# Altium schematic symbol library AD_Lib.SchLib: 1239 symbols (part 8 of 9) (continued)
## R2512_470/200V
designator R?, comment 470¦¸,1W
ÌùÆ¬µç×è; Manufacturer: KOA; pro-environment: RoHS; Quality: -55~155¡æ; other: 470¦¸,1W,1%,200V; OPN: RK73HW3ATTE4700F; PadsNum: 2; SN: SN; Category: µç×è; Part: RK73HW3ATTE4700F; Value: 470¦¸,1W; QTY: 4000; OPN_JLC: OPN_JLC; SN_JLC: SN_JLC; Price_JLC: 0
footprint R2512 (¹«ÖÆ6432£»Ó¢ÖÆ2512£»¹¦ÂÊ1W)
pins: 1, 2

## R2512_560/200V
designator R?, comment 560¦¸,1W
ÌùÆ¬µç×è; Manufacturer: KOA; pro-environment: RoHS; Quality: -55~155¡æ; other: 560¦¸,1W,1%,200V; OPN: RK73HW3ATTE5600F; PadsNum: 2; SN: SN; Category: µç×è; Part: RK73HW3ATTE5600F; Value: 560¦¸,1W; QTY: 4000; OPN_JLC: OPN_JLC; SN_JLC: SN_JLC; Price_JLC: 0
footprint R2512 (¹«ÖÆ6432£»Ó¢ÖÆ2512£»¹¦ÂÊ1W)
pins: 1, 2

## R2512_681/200V@2
designator R?, comment 681¦¸,1W
ÌùÆ¬µç×è; Manufacturer: Panasonic; pro-environment: RoHS; Quality: -55~155¡æ; other: 681¦¸,1W,5%,200V; OPN: ERJ-1TYJ681U; PadsNum: 2; SN: SN; Category: µç×è; Part: ERJ-1TYJ681U; Value: 681¦¸,1W; QTY: 4000; Price: 0.50778; OPN_JLC: OPN_JLC; SN_JLC: SN_JLC; Price_JLC: 0
footprint R2512 (¹«ÖÆ6432£»Ó¢ÖÆ2512£»¹¦ÂÊ1W)
pins: 1, 2

## R2512_750/200V
designator R?, comment 750¦¸,1W
ÌùÆ¬µç×è; Manufacturer: KOA; Part: RK73HW3ATTE5600F; pro-environment: RoHS; Quality: -55~155¡æ; other: 750¦¸,1W,1%,200V; OPN: RK73HW3ATTE7500F; PadsNum: 2; SN: SN; Category: µç×è; Value: 750¦¸,1W; QTY: 4000; OPN_JLC: OPN_JLC; SN_JLC: SN_JLC; Price_JLC: 0
footprint R2512 (¹«ÖÆ6432£»Ó¢ÖÆ2512£»¹¦ÂÊ1W)
pins: 1, 2

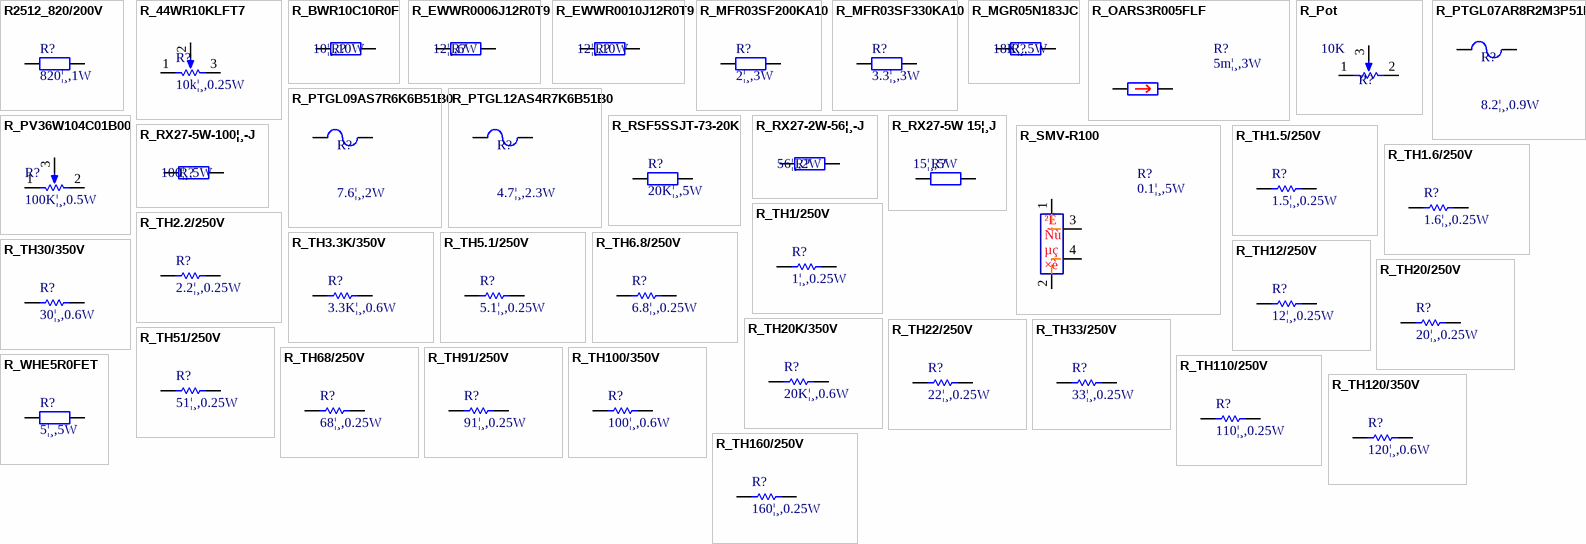
[diagram p36: symbols R2512_820/200V to R_WHE5R0FET]

## R2512_820/200V
designator R?, comment 820¦¸,1W
ÌùÆ¬µç×è; Manufacturer: KOA; pro-environment: RoHS; Quality: -55~155¡æ; other: 820¦¸,1W,1%,200V; OPN: RK73HW3ATTE8200F; PadsNum: 2; SN: SN; Category: µç×è; Part: RK73HW3ATTE8200F; Value: 820¦¸,1W; QTY: 4000; OPN_JLC: OPN_JLC; SN_JLC: SN_JLC; Price_JLC: 0
footprint R2512 (¹«ÖÆ6432£»Ó¢ÖÆ2512£»¹¦ÂÊ1W)
pins: 1, 2

## R_44WR10KLFT7
designator R?, comment 10k¦¸,0.25W
µçÎ»Æ÷,10k¦¸; Manufacturer: TT Electronics; pro-environment: RoHS; Quality: -65~150¡æ; other: 10k¦¸,0.25W,10%; OPN: 44WR10KLFT7; PadsNum: 0; SN: SN; Category: µç×è; Part: 44WR10KLFT7; Value: 10k¦¸,0.25W; QTY: 250; Price: 14.6367; OPN_JLC: OPN_JLC; SN_JLC: SN_JLC; Price_JLC: 0
footprint R_POT_44W (±íÌùµçÎ»Æ÷£¬Èç44WR10KLFT7)
pins: 1 TOP, 2 TAP, 3 BOT

## R_BWR10C10R0F
designator R?, comment 10¦¸,10W
¹¦ÂÊµç×è,10¦¸,10W; Manufacturer: KOA; Part: BWR10C10R0F; Quality: -40¡æ~155¡æ; SN: 03.4.38.12.99010001S; other: 10¦¸,10W,5%,100ppm; PadsNum: 0; QTY: ?; Value: 10¦¸,10W; Price: ?; Category: µç×è; OPN: BWR10C10R0F; OPN_JLC: OPN_JLC; SN_JLC: SN_JLC; Price_JLC: 0
footprint BWR10 (KOAÖ®BWR10ÏµÁÐË®Äàµç×è£¬10W)
pins: 1, 2

## R_EWWR0006J12R0T9
designator R?, comment 12¦¸,6W
¹¦ÂÊµç×è; 12¦¸; 6W; Manufacturer: ¿ª²½î£Ë¼; Part: EWWR0006J12R0T9; Quality: -40¡æ~155¡æ; other: 12¦¸,6W,5%; PadsNum: 0; SN: SN; QTY: 100; Value: 12¦¸,6W; Price: -; Category: µç×è; OPN: -; OPN_JLC: EWWR0006J12R0T9; SN_JLC: C348949; Price_JLC: 2.03
footprint R_EWWR0006 (Footprint not found)
pins: 1, 2

## R_EWWR0010J12R0T9
designator R?, comment 12¦¸,10W
¹¦ÂÊµç×è; 12¦¸; 10W; Manufacturer: ¿ª²½î£Ë¼; Part: EWWR0010J12R0T9; Quality: -40¡æ~155¡æ; other: 12¦¸,10W,5%; PadsNum: 0; SN: SN; QTY: 50; Value: 12¦¸,10W; Price: -; Category: µç×è; OPN: -; OPN_JLC: EWWR0010J12R0T9; SN_JLC: C349086; Price_JLC: 3.24
footprint R_EWWR0010 (¿ª²½î£Ë¼Ö®EWWR0010ÏµÁÐ¹¤¾ßµç×è£¬ÈçEWWR0010J12R0T9)
pins: 1, 2

## R_MFR03SF200KA10
designator R?, comment 2¦¸,3W
¹¦ÂÊµç×è; 2¦¸/3W; 1%; 50ppm; Manufacturer: UNI-ROYAL; pro-environment: RoHS; Quality: -55~150¡æ; other: 2¦¸,3W,1%,50ppm; OPN: MFR03SF200KA10; PadsNum: 0; SN: SN; Category: µç×è; Part: MFR03SF200KA10; Value: 2¦¸,3W; QTY: 1000; Price: -; OPN_JLC: MFR03SF200KA10; SN_JLC: C69890; Price_JLC: 0.229423
footprint R_MF3WS (Footprint not found)
pins: 1, 2

## R_MFR03SF330KA10
designator R?, comment 3.3¦¸,3W
¹¦ÂÊµç×è; 3.3¦¸/3W; 1%; 50ppm; Manufacturer: UNI-ROYAL; pro-environment: RoHS; Quality: -55~150¡æ; other: 3.3¦¸,3W,1%,50ppm; OPN: MFR03SF330KA10; PadsNum: 0; SN: SN; Category: µç×è; Part: MFR03SF330KA10; Value: 3.3¦¸,3W; QTY: 1000; Price: -; OPN_JLC: MFR03SF330KA10; SN_JLC: C83331; Price_JLC: 0.233533
footprint R_MF3WS (Footprint not found)
pins: 1, 2

## R_MGR05N183JC
designator R?, comment 18K¦¸,5W
¹¦ÂÊµç×è,18K¦¸,5W; Manufacturer: Ã×¿âÁú; Part: MGR05N183JC; Quality: -55¡æ~125¡æ; PadsNum: 0; SN: SN; QTY: ?; Value: 18K¦¸,5W; Price: ?; Category: µç×è; OPN: MGR05N183JC; OPN_JLC: OPN_JLC; SN_JLC: SN_JLC; Price_JLC: 0
footprint MGR05 (Ã×¿âÁúÖ®Ë®Äàµç×è)
pins: 1, 2

## R_OARS3R005FLF
designator R?, comment 5m¦¸,3W
²ÉÑùµç×è; 5m¦¸; 3W; Manufacturer: TT Electronics; Other: 5m¦¸;3W;1%;40ppm; Quality: -55~140¡æ; pro-environment: RoHS; SN: 03.4.38.27.993R0001S; OPN: OARS3R005FLF; PadsNum: 0; Value: 5m¦¸,3W; Price: 4.4928; Category: µç×è; OPN_JLC: OPN_JLC; SN_JLC: SN_JLC; Price_JLC: 0
footprint R2512 (¹«ÖÆ6432£»Ó¢ÖÆ2512£»¹¦ÂÊ1W)
pins: 1, 2

## R_Pot
designator R?, comment 10K
µçÎ»Æ÷; PadsNum: 0; OPN_JLC: OPN_JLC; SN_JLC: SN_JLC; Price_JLC: 0
footprint Rpot1 (Variable Resistor, Thru-Hole; 3 Leads)
footprint Rpot2 (Variable Resistor, Thru-Hole; 3 Leads)
pins: 1 TOP, 2 BOT, 3 TAP
1 alternate drawing of the same symbol

## R_PTGL07AR8R2M3P51B0
designator R?, comment 8.2¦¸,0.9W
PTC; 0.16A/56V; 8.2¦¸; Manufacturer: Murata; Other: 0.16A;56V;20%; Quality: -10¡æ~60¡æ; pro-environment: RoHS; SN: 03.4.38.17.9904R701S; OPN: PTGL12AS4R7K6B51B0; PadsNum: 0; Value: 8.2¦¸,0.9W; QTY: 500; part: PTGL12AS4R7K6B51B0; Price: 4.6215; OPN_JLC: OPN_JLC; SN_JLC: SN_JLC; Price_JLC: 0; Category: ÈÈÃôµç×è
footprint PTGL07AR8R2M3P (MurutaÖ®PTC£¬PTGL07AR8R2M3PÏµÁÐ)
pins: 1, 2

## R_PTGL09AS7R6K6B51B0
designator R?, comment 7.6¦¸,2W
PTC; 2.2A/140V; 7.6¦¸; Manufacturer: Murata; Other: 2.2A;140V;10%; Quality: -30¡æ~85¡æ; pro-environment: RoHS; OPN: PTGL09AS7R6K6B51B0; PadsNum: 0; Value: 7.6¦¸,2W; SN: SN; QTY: 500; part: PTGL09AS7R6K6B51B0; Price: 4.9725; OPN_JLC: OPN_JLC; SN_JLC: SN_JLC; Price_JLC: 0; Category: ÈÈÃôµç×è
footprint PTGL09AS4R7K6B (MurutaÖ®PTC£¬PTGL09AS4R7K6BÏµÁÐ)
pins: 1, 2

## R_PTGL12AS4R7K6B51B0
designator R?, comment 4.7¦¸,2.3W
PTC; 3.5A/140V; 4.7¦¸; Manufacturer: Murata; Other: 3.5A;140V;10%; Quality: -30¡æ~85¡æ; pro-environment: RoHS; SN: 03.4.38.17.9904R701S; OPN: PTGL12AS4R7K6B51B0; PadsNum: 0; Value: 4.7¦¸,2.3W; QTY: 300; part: PTGL12AS4R7K6B51B0; Price: 6.9732; OPN_JLC: OPN_JLC; SN_JLC: SN_JLC; Price_JLC: 0; Category: ÈÈÃôµç×è
footprint PTGL12AS4R7K6B (MurutaÖ®PTC£¬PTGL12AS4R7K6BÏµÁÐ)
pins: 1, 2

## R_PV36W104C01B00
designator R?, comment 100K¦¸,0.5W
µçÎ»Æ÷,100k¦¸,25turn; Manufacturer: Bourns; pro-environment: RoHS; Quality: -55~155¡æ; SN: 03.4.38.29.99010401S; other: 100k¦¸,0.5W,10%,25turn; OPN: PV36W104C01B00; PadsNum: 0; Category: µç×è; Part: PV36W104C01B00; Value: 100K¦¸,0.5W; QTY: 100; Price: 8.4942; OPN_JLC: OPN_JLC; SN_JLC: SN_JLC; Price_JLC: 0
footprint Rpot1 (Variable Resistor, Thru-Hole; 3 Leads)
pins: 1 TOP, 2 BOT, 3 TAP

## R_RSF5SSJT-73-20K
designator R?, comment 20K¦¸,5W
Ö±²åµç×è,20K,5W; Manufacturer: Yageo; pro-environment: RoHS; Quality: -55~155¡æ; other: 20k¦¸,0.6W,1%,350V; OPN: RSF5SSJT-73-20K; PadsNum: 0; SN: SN; Category: µç×è; Part: RSF5SSJT-73-20K; Value: 20K¦¸,5W; QTY: 5000; Price: 0.07722; OPN_JLC: OPN_JLC; SN_JLC: SN_JLC; Price_JLC: 0
footprint RSF5SS
pins: 1, 2

## R_RX27-2W-56¦¸-J
designator R?, comment 56¦¸,2W
¹¦ÂÊµç×è,56¦¸,2W; Manufacturer: ËÄ´¨ÓÀÐÇ; Part: RX27-2W-56¦¸-J; Quality: -55¡æ~ +70¡æ; SN: 03.4.38.12.99056001S; PadsNum: 0; QTY: 200; Value: 56¦¸,2W; Price: ?; Category: µç×è; OPN: RX27-2W-56¦¸-J; OPN_JLC: OPN_JLC; SN_JLC: SN_JLC; Price_JLC: 0
footprint RX27-2W
pins: 1, 2

## R_RX27-5W 15¦¸J
designator R?, comment 15¦¸,5W
¹¦ÂÊµç×è,15¦¸,5W; Manufacturer: ËÄ´¨ÓÀÐÇ; Part: RY27-5W 15¦¸J; Quality: -55¡æ~ +70¡æ; SN: 03.4.38.12.99015001S; PadsNum: 0; QTY: 200; Price: ?; Category: µç×è; OPN: RY27-5W 15¦¸J; other: 15¦¸,5W; Value: 15¦¸,5W; OPN_JLC: OPN_JLC; SN_JLC: SN_JLC; Price_JLC: 0
footprint RX27-5W
pins: 1, 2

## R_RX27-5W-100¦¸-J
designator R?, comment 100¦¸,5W
¹¦ÂÊµç×è,100¦¸,5W; Manufacturer: ËÄ´¨ÓÀÐÇ; Part: RX27-5W-100¦¸-J; Quality: -55¡æ~ +70¡æ; SN: 03.4.38.12.99010101S; PadsNum: 0; QTY: 200; Value: 100¦¸,5W; Price: ?; Category: µç×è; OPN: RX27-5W-100¦¸-J; OPN_JLC: OPN_JLC; SN_JLC: SN_JLC; Price_JLC: 0
footprint RX27-5W
pins: 1, 2

## R_SMV-R100
designator R?, comment 0.1¦¸,5W
²ÉÑùµç×è; Manufacturer: Isabellenhuette; Other: 1%;30ppm; Quality: -55~140¡æ; pro-environment: RoHS; OPN: SMV-R100-1.0; PadsNum: 0; SN: SN; Value: 0.1¦¸,5W; Price: ?; Category: µç×è; OPN_JLC: OPN_JLC; SN_JLC: SN_JLC; Price_JLC: 0
footprint SMV
pins: 1, 2, 3, 4
text: ²É; Ñù; µç; ×è

## R_TH1.5/250V
designator R?, comment 1.5¦¸,0.25W
Ö±²åµç×è; 0.25W; Manufacturer: UNI-ROYAL; pro-environment: RoHS; Quality: -55~155¡æ; other: 1.5¦¸,0.25W,1%,250V; OPN: MFR0W4F150KA50; PadsNum: 0; SN: SN; Category: µç×è; Part: MFR0W4F150KA50; Value: 1.5¦¸,0.25W; QTY: 5000; Price: 0.049701; OPN_JLC: MFR0W4F150KA50; SN_JLC: C69894; Price_JLC: 0
footprint R_AXIAL0.4 (Axial Device, Thru-Hole; 2 Leads; 0.4 in Pin Spacing)
pins: 1, 2

## R_TH1.6/250V
designator R?, comment 1.6¦¸,0.25W
Ö±²åµç×è; 0.25W; Manufacturer: UNI-ROYAL; pro-environment: RoHS; Quality: -55~155¡æ; other: 1.6¦¸,0.25W,1%,250V; OPN: MFR0W4F160KA50; PadsNum: 0; SN: SN; Category: µç×è; Part: MFR0W4F160KA50; Value: 1.6¦¸,0.25W; QTY: 5000; Price: 0.049701; OPN_JLC: MFR0W4F160KA50; SN_JLC: C66724; Price_JLC: 0
footprint R_AXIAL0.4 (Axial Device, Thru-Hole; 2 Leads; 0.4 in Pin Spacing)
pins: 1, 2

## R_TH1/250V
designator R?, comment 1¦¸,0.25W
Ö±²åµç×è; 0.25W; Manufacturer: UNI-ROYAL; pro-environment: RoHS; Quality: -55~155¡æ; other: 1¦¸,0.25W,1%,250V; OPN: MFR0W4F100KA50; PadsNum: 0; SN: SN; Category: µç×è; Part: MFR0W4F100KA50; Value: 1¦¸,0.25W; QTY: 5000; Price: 0.045941; OPN_JLC: MFR0W4F100KA50; SN_JLC: C69893; Price_JLC: 0
footprint R_AXIAL0.4 (Axial Device, Thru-Hole; 2 Leads; 0.4 in Pin Spacing)
pins: 1, 2

## R_TH2.2/250V
designator R?, comment 2.2¦¸,0.25W
Ö±²åµç×è; 0.25W; Manufacturer: UNI-ROYAL; pro-environment: RoHS; Quality: -55~155¡æ; other: 2.2¦¸,0.25W,1%,250V; OPN: MFR0W4F220KA50; PadsNum: 0; SN: SN; Category: µç×è; Part: MFR0W4F220KA50; Value: 2.2¦¸,0.25W; QTY: 5000; Price: 0.045831; OPN_JLC: MFR0W4F220KA50; SN_JLC: C59741; Price_JLC: 0
footprint R_AXIAL0.4 (Axial Device, Thru-Hole; 2 Leads; 0.4 in Pin Spacing)
pins: 1, 2

## R_TH3.3K/350V
designator R?, comment 3.3K¦¸,0.6W
Ö±²åµç×è; 0.6W; Manufacturer: Yageo; pro-environment: RoHS; Quality: -55~155¡æ; other: 3.3k¦¸,0.6W,1%,350V; OPN: MF0207FTE52-3K3; PadsNum: 0; SN: SN; Category: µç×è; Part: MF0207FTE52-3K3; Value: 3.3K¦¸,0.6W; QTY: 5000; Price: 0.07722; OPN_JLC: OPN_JLC; SN_JLC: SN_JLC; Price_JLC: 0
footprint R_AXIAL0.4 (Axial Device, Thru-Hole; 2 Leads; 0.4 in Pin Spacing)
pins: 1, 2

## R_TH5.1/250V
designator R?, comment 5.1¦¸,0.25W
Ö±²åµç×è; 0.25W; Manufacturer: UNI-ROYAL; pro-environment: RoHS; Quality: -55~155¡æ; other: 5.1¦¸,0.25W,1%,250V; OPN: MFR0W4F510KA50; PadsNum: 0; SN: SN; Category: µç×è; Part: MFR0W4F510KA50; Value: 5.1¦¸,0.25W; QTY: 5000; Price: 0.045941; OPN_JLC: MFR0W4F510KA50; SN_JLC: C58639; Price_JLC: 0
footprint R_AXIAL0.4 (Axial Device, Thru-Hole; 2 Leads; 0.4 in Pin Spacing)
pins: 1, 2

## R_TH6.8/250V
designator R?, comment 6.8¦¸,0.25W
Ö±²åµç×è; 0.25W; Manufacturer: Yageo; pro-environment: RoHS; Quality: -55~155¡æ; other: 6.8¦¸,0.25W,1%,250V; OPN: MFR-25FTF52-6R8; PadsNum: 0; SN: SN; Category: µç×è; Part: MFR-25FTF52-6R8; Value: 6.8¦¸,0.25W; QTY: 5000; Price: 0.13654; OPN_JLC: MFR-25FTF52-6R8; SN_JLC: C173062; Price_JLC: 0
footprint R_AXIAL0.4 (Axial Device, Thru-Hole; 2 Leads; 0.4 in Pin Spacing)
pins: 1, 2

## R_TH12/250V
designator R?, comment 12¦¸,0.25W
Ö±²åµç×è; 0.25W; Manufacturer: CCO(Ç§Ö¾µç×Ó); pro-environment: RoHS; Quality: -55~155¡æ; other: 12¦¸,0.25W,1%,250V; OPN: MF1/4W-12¦¸¡À1% T52; PadsNum: 0; SN: SN; Category: µç×è; Part: MF1/4W-12¦¸¡À1% T52; Value: 12¦¸,0.25W; QTY: 5000; Price: 0.036724; OPN_JLC: MF1/4W-12¦¸¡À1% T52; SN_JLC: C119283; Price_JLC: 0
footprint R_AXIAL0.4 (Axial Device, Thru-Hole; 2 Leads; 0.4 in Pin Spacing)
pins: 1, 2

## R_TH20/250V
designator R?, comment 20¦¸,0.25W
Ö±²åµç×è; 0.25W; Manufacturer: UNI-ROYAL; pro-environment: RoHS; Quality: -55~155¡æ; other: 20¦¸,0.25W,1%,250V; OPN: MFR0W4F200JA50; PadsNum: 0; SN: SN; Category: µç×è; Part: MFR0W4F200JA50; Value: 20¦¸,0.25W; QTY: 5000; Price: 0.035413; OPN_JLC: MFR0W4F200JA50; SN_JLC: C58663; Price_JLC: 0
footprint R_AXIAL0.4 (Axial Device, Thru-Hole; 2 Leads; 0.4 in Pin Spacing)
pins: 1, 2

## R_TH20K/350V
designator R?, comment 20K¦¸,0.6W
Ö±²åµç×è; 0.6W; Manufacturer: Yageo; pro-environment: RoHS; Quality: -55~155¡æ; SN: 03.4.38.30.99020301S; other: 20k¦¸,0.6W,1%,350V; OPN: MF0207FTE52-20K; PadsNum: 0; Category: µç×è; Part: MF0207FTE52-20K; Value: 20K¦¸,0.6W; QTY: 5000; Price: 0.07722; OPN_JLC: OPN_JLC; SN_JLC: SN_JLC; Price_JLC: 0
footprint R_AXIAL0.4 (Axial Device, Thru-Hole; 2 Leads; 0.4 in Pin Spacing)
pins: 1, 2

## R_TH22/250V
designator R?, comment 22¦¸,0.25W
Ö±²åµç×è; 0.25W; Manufacturer: UNI-ROYAL; pro-environment: RoHS; Quality: -55~155¡æ; other: 22¦¸,0.25W,1%,250V; OPN: MFR0W4F220JA50; PadsNum: 0; SN: SN; Category: µç×è; Part: MFR0W4F220JA50; Value: 22¦¸,0.25W; QTY: 5000; Price: 0.035328; OPN_JLC: MFR0W4F220JA50; SN_JLC: C58611; Price_JLC: 0
footprint R_AXIAL0.4 (Axial Device, Thru-Hole; 2 Leads; 0.4 in Pin Spacing)
pins: 1, 2

## R_TH30/350V
designator R?, comment 30¦¸,0.6W
Ö±²åµç×è; 0.6W; Manufacturer: Yageo; pro-environment: RoHS; Quality: -55~155¡æ; SN: 03.4.38.30.99030001S; other: 30¦¸,0.6W,1%,350V; OPN: MF0207FTE52-30R; PadsNum: 0; Category: µç×è; Part: MF0207FTE52-30R; Value: 30¦¸,0.6W; QTY: 5000; Price: 0.07722; OPN_JLC: OPN_JLC; SN_JLC: SN_JLC; Price_JLC: 0
footprint R_AXIAL0.4 (Axial Device, Thru-Hole; 2 Leads; 0.4 in Pin Spacing)
pins: 1, 2

## R_TH33/250V
designator R?, comment 33¦¸,0.25W
Ö±²åµç×è; 0.25W; Manufacturer: UNI-ROYAL; pro-environment: RoHS; Quality: -55~155¡æ; other: 33¦¸,0.25W,1%,250V; OPN: MFR0W4F330JA50; PadsNum: 0; SN: SN; Category: µç×è; Part: MFR0W4F330JA50; Value: 33¦¸,0.25W; QTY: 5000; Price: 0.035413; OPN_JLC: MFR0W4F330JA50; SN_JLC: C58650; Price_JLC: 0
footprint R_AXIAL0.4 (Axial Device, Thru-Hole; 2 Leads; 0.4 in Pin Spacing)
pins: 1, 2

## R_TH51/250V
designator R?, comment 51¦¸,0.25W
Ö±²åµç×è; 0.25W; Manufacturer: UNI-ROYAL; pro-environment: RoHS; Quality: -55~155¡æ; other: 51¦¸,0.25W,1%,250V; OPN: MFR0W4F510JA50; PadsNum: 0; SN: SN; Category: µç×è; Part: MFR0W4F510JA50; Value: 51¦¸,0.25W; QTY: 5000; Price: 0.035413; OPN_JLC: MFR0W4F510JA50; SN_JLC: C58637; Price_JLC: 0
footprint R_AXIAL0.4 (Axial Device, Thru-Hole; 2 Leads; 0.4 in Pin Spacing)
pins: 1, 2

## R_TH68/250V
designator R?, comment 68¦¸,0.25W
Ö±²åµç×è; 0.25W; Manufacturer: UNI-ROYAL; pro-environment: RoHS; Quality: -55~155¡æ; other: 68¦¸,0.25W,1%,250V; OPN: MFR0W4F680JA50; PadsNum: 0; SN: SN; Category: µç×è; Part: MFR0W4F680JA50; Value: 68¦¸,0.25W; QTY: 5000; Price: 0.035328; OPN_JLC: MFR0W4F680JA50; SN_JLC: C58629; Price_JLC: 0
footprint R_AXIAL0.4 (Axial Device, Thru-Hole; 2 Leads; 0.4 in Pin Spacing)
pins: 1, 2

## R_TH91/250V
designator R?, comment 91¦¸,0.25W
Ö±²åµç×è; 0.25W; Manufacturer: UNI-ROYAL; pro-environment: RoHS; Quality: -55~155¡æ; other: 91¦¸,0.25W,1%,250V; OPN: MFR0W4F910JA50; PadsNum: 0; SN: SN; Category: µç×è; Part: MFR0W4F910JA50; Value: 91¦¸,0.25W; QTY: 5000; Price: 0.032826; OPN_JLC: MFR0W4F910JA50; SN_JLC: C92225; Price_JLC: 0
footprint R_AXIAL0.4 (Axial Device, Thru-Hole; 2 Leads; 0.4 in Pin Spacing)
pins: 1, 2

## R_TH100/350V
designator R?, comment 100¦¸,0.6W
Ö±²åµç×è; 0.6W; Manufacturer: Yageo; pro-environment: RoHS; Quality: -55~155¡æ; SN: 03.4.38.30.99010101S; other: 100¦¸,0.6W,1%,350V; OPN: MF0207FTE52-100R; PadsNum: 0; Category: µç×è; Part: MF0207FTE52-100R; Value: 100¦¸,0.6W; QTY: 5000; Price: 0.07722; OPN_JLC: OPN_JLC; SN_JLC: SN_JLC; Price_JLC: 0
footprint R_AXIAL0.4 (Axial Device, Thru-Hole; 2 Leads; 0.4 in Pin Spacing)
pins: 1, 2

## R_TH110/250V
designator R?, comment 110¦¸,0.25W
Ö±²åµç×è; 0.25W; Manufacturer: UNI-ROYAL; pro-environment: RoHS; Quality: -55~155¡æ; other: 110¦¸,0.25W,1%,250V; OPN: MFR0W4F1100A50; PadsNum: 0; SN: SN; Category: µç×è; Part: MFR0W4F1100A50; Value: 110¦¸,0.25W; QTY: 5000; Price: 0.039403; OPN_JLC: MFR0W4F1100A50; SN_JLC: C111530; Price_JLC: 0
footprint R_AXIAL0.4 (Axial Device, Thru-Hole; 2 Leads; 0.4 in Pin Spacing)
pins: 1, 2

## R_TH120/350V
designator R?, comment 120¦¸,0.6W
Ö±²åµç×è; 0.6W; Manufacturer: Yageo; pro-environment: RoHS; Quality: -55~155¡æ; SN: 03.4.38.30.99012101S; other: 120¦¸,0.6W,1%,350V; OPN: MF0207FTE52-120R; PadsNum: 0; Category: µç×è; Part: MF0207FTE52-120R; Value: 120¦¸,0.6W; QTY: 5000; Price: 0.07722; OPN_JLC: OPN_JLC; SN_JLC: SN_JLC; Price_JLC: 0
footprint R_AXIAL0.4 (Axial Device, Thru-Hole; 2 Leads; 0.4 in Pin Spacing)
pins: 1, 2

## R_TH160/250V
designator R?, comment 160¦¸,0.25W
Ö±²åµç×è; 0.25W; Manufacturer: UNI-ROYAL; pro-environment: RoHS; Quality: -55~155¡æ; other: 110¦¸,0.25W,1%,250V; OPN: MFR0W4F1600A50; PadsNum: 0; SN: SN; Category: µç×è; Part: MFR0W4F1600A50; Value: 160¦¸,0.25W; QTY: 5000; Price: 0.035333; OPN_JLC: MFR0W4F1600A50; SN_JLC: C58131; Price_JLC: 0
footprint R_AXIAL0.4 (Axial Device, Thru-Hole; 2 Leads; 0.4 in Pin Spacing)
pins: 1, 2

## R_WHE5R0FET
designator R?, comment 5¦¸,5W
¾«ÃÜµç×è; 5¦¸/5W; 1%; 50ppm; Manufacturer: Ohmite; Part: 5¦¸/5W,1%; pro-environment: RoHS; Quality: -55~150¡æ; other: 5¦¸,5W,1%,50ppm; OPN: WHE5R0FET; PadsNum: 2; SN: SN; Category: µç×è; Value: 5¦¸,5W; QTY: 500; Price: 4.7573; OPN_JLC: OPN_JLC; SN_JLC: SN_JLC; Price_JLC: 0
footprint R_WH-NE (Ohmite¹¦ÂÊµç×èWH£¬WNÏµÁÐ)
pins: 1, 2

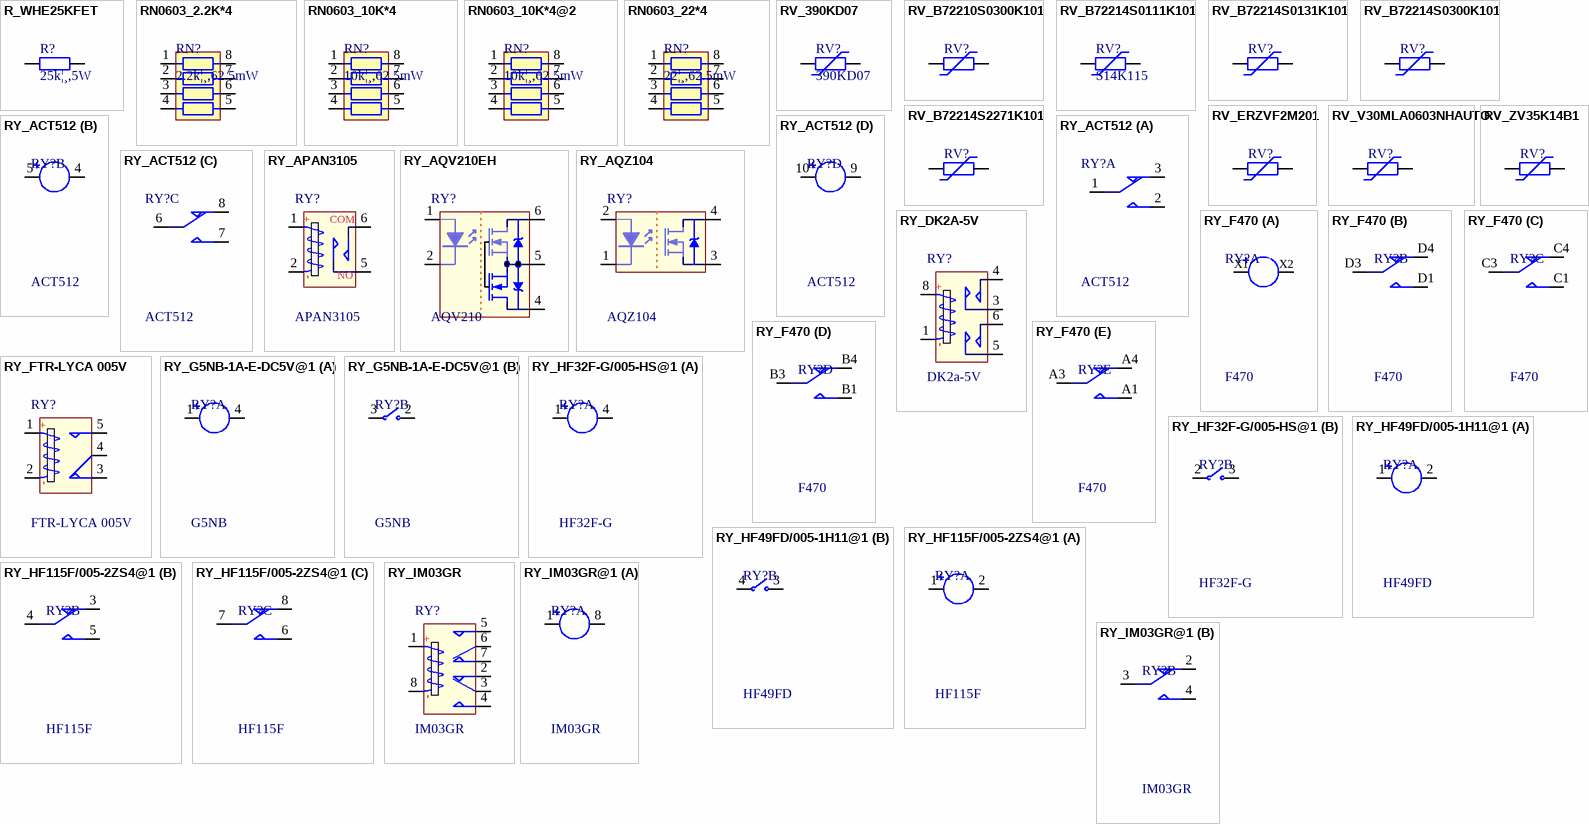
[diagram p37: symbols R_WHE25KFET to RY_IM03GR@1]

## R_WHE25KFET
designator R?, comment 25k¦¸,5W
¹¦ÂÊµç×è; 25k¦¸/5W; 1%; 20ppm; Manufacturer: Ohmite; pro-environment: RoHS; Quality: -55~150¡æ; other: 25k¦¸,5W,1%,100V,20ppm; OPN: WHE25KFET; PadsNum: 0; SN: SN; Category: µç×è; Part: WHE25KFET; Value: 25k¦¸,5W; QTY: 5000; Price: 0.83187; OPN_JLC: OPN_JLC; SN_JLC: SN_JLC; Price_JLC: 0
footprint R_WH-NE (Ohmite¹¦ÂÊµç×èWH£¬WNÏµÁÐ)
pins: 1, 2
